# Altium footprint library Connectors_Old.PcbLib: 246 footprints (part 9 of 18)
Each footprint in its own frame and in the unit in brackets; x right, y up, seen from the top. Pads: shape width x height; smd on the part's side, far side on the other; paste and mask are expansions set on the pad; w line width, h text height; cw(c..) or ccw(c..) is an arc to the next point about the centre after c.
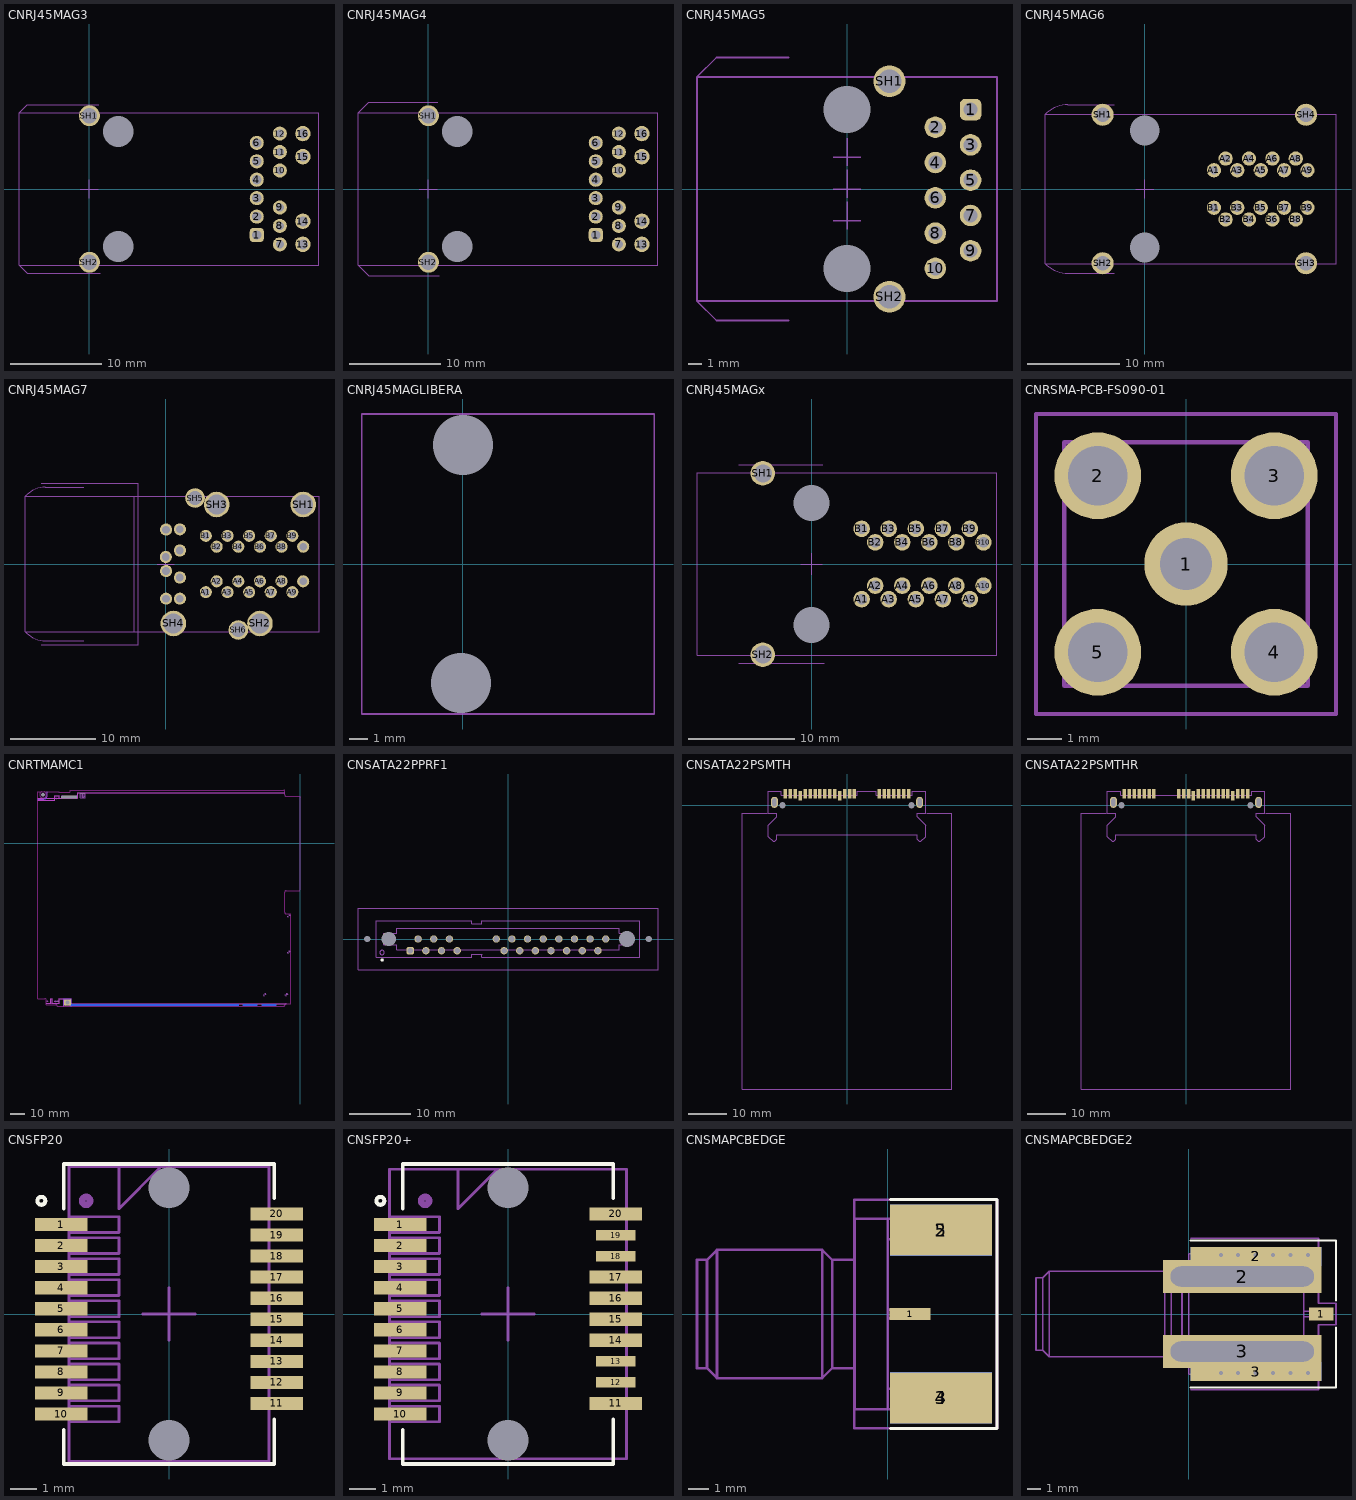
[diagram p8: the footprints below, top view; thin cyan lines are the x and y axes]

## CNRJ45MAG3 [mm] "Ethernet connector with magnetics and 3 LED"
height 15.01
pads (20):
  rrect50% 1.55x1.55 hole 1: 1(18.42,-5.07)
  round 1.55 hole 1: 2(18.42,-3.04) 3(18.42,-1.01) 4(18.42,1.02) 5(18.42,3.05) 6(18.42,5.08)
  round 1.55 hole 0.9: 7(20.96,-6.09) 8(20.96,-4.06) 9(20.96,-2.03) 10(20.96,2.04) 11(20.96,4.07) 12(20.96,6.1)
  round 1.7 hole 1.1: 13(23.5,-6.09) 14(23.5,-3.55) 15(23.5,3.56) 16(23.5,6.1)
  round 0 hole 3.4 unplated mask+1.8: MH1(3.18,-6.35) MH2(3.18,6.35)
  round 2.3 hole 1.7: SH1(0,8.065) SH2(0,-8.065)
Mechanical 13:
  lines w0.102: 1.05,9.3 -6.85,9.3 -7.75,8.4 ; 1.2,-9.3 -6.85,-9.3 -7.75,-8.4 ; -7.75,-8.4 -7.75,8.4 ; -7.75,-8.4 25.27,-8.4 25.27,8.4 -7.75,8.4
Mechanical 15:
  lines w0.102: -1,0 1,0 ; 0,-1 0,1
3D body: height 1.5, standoff 1, extent -7.239,1.605 10.7,2.205
3D body: height 1.5, standoff 1, extent -7.239,0.335 10.7,0.935
3D body: height 1.5, standoff 1, extent -7.239,2.875 10.7,3.475
3D body: height 1.5, standoff 1, extent -7.239,4.145 10.7,4.745
3D body: height 1.5, standoff 1, extent -7.239,-4.745 10.7,-4.145
3D body: height 1.5, standoff 1, extent -7.239,-3.475 10.7,-2.875
3D body: height 1.5, standoff 1, extent -7.239,-0.935 10.7,-0.335
3D body: height 13.9, standoff 13.4, extent -7.75,-8.4 25.3,8.4
3D body: height 1, standoff 0, extent -7.75,-8.4 25.3,8.4
3D body: height 1.5, standoff 1, extent -7.239,-2.205 10.7,-1.605
3D body: height 0, standoff -3.3, extent 1.516,-8.009 4.834,-4.691
3D body: height 0, standoff -3.3, extent 1.516,4.691 4.834,8.009
3D body: height 0, standoff -3.3, extent -0.794,-8.872 0.794,-7.258
3D body: height 0, standoff -3.3, extent -0.794,7.258 0.794,8.872
3D body: height 13, standoff 12, extent -7.9,-7 -7.75,-5
3D body: height 13, standoff 12, extent -7.9,5 -7.75,7
3D body: height 0, standoff -3.3, extent 17.907,-5.574 18.926,-4.554
3D body: height 0, standoff -3.3, extent 17.907,-3.544 18.926,-2.524
3D body: height 0, standoff -3.3, extent 17.907,-1.514 18.926,-0.494
3D body: height 0, standoff -3.3, extent 17.907,0.516 18.926,1.536
3D body: height 0, standoff -3.3, extent 17.907,2.546 18.926,3.566
3D body: height 0, standoff -3.3, extent 17.907,4.576 18.926,5.596
3D body: height 0, standoff -3.3, extent 20.447,5.596 21.466,6.616
3D body: height 0, standoff -3.3, extent 20.447,3.566 21.466,4.586
3D body: height 0, standoff -3.3, extent 20.447,1.536 21.466,2.556
3D body: height 0, standoff -3.3, extent 20.447,-2.534 21.466,-1.514
3D body: height 0, standoff -3.3, extent 20.447,-4.564 21.466,-3.544
3D body: height 0, standoff -3.3, extent 20.447,-6.594 21.466,-5.574
3D body: height 0, standoff -3.3, extent 22.951,-4.1 24.065,-2.986
3D body: height 0, standoff -3.3, extent 22.936,-6.647 24.05,-5.534
3D body: height 0, standoff -3.3, extent 22.951,3.01 24.065,4.124
3D body: height 0, standoff -3.3, extent 22.951,5.55 24.065,6.664
3D body: height 13.4, standoff 11, extent -7.75,-8.4 25.27,8.4
3D body: height 11, standoff 8.9, extent -7.75,-8.4 25.27,8.4
3D body: height 8.9, standoff 1, extent -7.75,-8.4 25.27,8.4
3D body: height 11.6, standoff 1, extent -7.361,-6.8 10.639,6.8
3D body: height 0, standoff -3.3, extent 23.18,-6.42 23.88,-5.72
3D body: height 0, standoff -3.3, extent 23.18,-3.88 23.88,-3.18
3D body: height 0, standoff -3.3, extent 23.18,3.23 23.88,3.93
3D body: height 0, standoff -3.3, extent 23.18,5.77 23.88,6.47

## CNRJ45MAG4 [mm] "Ethernet connector with magnetics and 3 LED"
height 15.01
pads (20):
  rrect50% 1.55x1.55 hole 1: 1(18.42,-5.07)
  round 1.55 hole 1: 2(18.42,-3.04) 3(18.42,-1.01) 4(18.42,1.02) 5(18.42,3.05) 6(18.42,5.08)
  round 1.55 hole 0.9: 7(20.96,-6.09) 8(20.96,-4.06) 9(20.96,-2.03) 10(20.96,2.04) 11(20.96,4.07) 12(20.96,6.1)
  round 1.7 hole 1.1: 13(23.5,-6.09) 14(23.5,-3.55) 15(23.5,3.56) 16(23.5,6.1)
  round 0 hole 3.4 unplated mask+1.8: MH1(3.18,-6.35) MH2(3.18,6.35)
  round 2.3 hole 1.7: SH1(0,8.065) SH2(0,-8.065)
Mechanical 13:
  lines w0.102: 1.05,9.575 -6.575,9.575 -7.75,8.4 ; 1.2,-9.575 -6.575,-9.575 -6.577,-9.573 -7.75,-8.4 ; -7.75,-8.4 -7.75,8.4 ; -7.75,-8.4 25.27,-8.4 25.27,8.4 -7.75,8.4
Mechanical 15:
  lines w0.102: -1,0 1,0 ; 0,-1 0,1
3D body: height 10, standoff 8, extent -7.7,-8.4 25.3,8.4
3D body: height 8, standoff 3, extent -7.7,-8.4 25.3,8.4
3D body: height 13.61, standoff 10, extent -7.7,-8.4 25.3,8.4
3D body: height 3, standoff 0, extent -7.7,-8.4 25.3,8.4
3D body: height 4, standoff 3, extent -7.75,-1.2 3,-0.2
3D body: height 0, standoff -3.3, extent 1.516,-8.009 4.834,-4.691
3D body: height 0, standoff -3.3, extent 1.516,4.691 4.834,8.009
3D body: height 0, standoff -3.3, extent -0.794,-8.872 0.794,-7.258
3D body: height 0, standoff -3.3, extent -0.794,7.258 0.794,8.872
3D body: height 15.01, standoff 13.61, extent -7.75,-6 3.1,-4.8
3D body: height 15.01, standoff 13.61, extent -7.75,4.8 3.1,6
3D body: height 4, standoff 3, extent -7.75,-5.7 3,-4.7
3D body: height 4, standoff 3, extent -7.75,-4.2 3,-3.2
3D body: height 4, standoff 3, extent -7.75,-2.7 3,-1.7
3D body: height 4, standoff 3, extent -7.75,0.3 3,1.3
3D body: height 4, standoff 3, extent -7.75,1.8 3,2.8
3D body: height 4, standoff 3, extent -7.75,3.3 3,4.3
3D body: height 4, standoff 3, extent -7.75,4.8 3,5.8
3D body: height 11, standoff 10, extent -8.1,-6.9 -7.75,-5.3
3D body: height 11, standoff 10, extent -8.1,5.3 -7.75,6.9
3D body: height 0, standoff -3.3, extent 17.907,-5.574 18.926,-4.554
3D body: height 0, standoff -3.3, extent 17.907,-3.544 18.926,-2.524
3D body: height 0, standoff -3.3, extent 17.907,-1.514 18.926,-0.494
3D body: height 0, standoff -3.3, extent 17.907,0.516 18.926,1.536
3D body: height 0, standoff -3.3, extent 17.907,2.546 18.926,3.566
3D body: height 0, standoff -3.3, extent 17.907,4.576 18.926,5.596
3D body: height 0, standoff -3.3, extent 20.447,5.596 21.466,6.616
3D body: height 0, standoff -3.3, extent 20.447,3.566 21.466,4.586
3D body: height 0, standoff -3.3, extent 20.447,1.536 21.466,2.556
3D body: height 0, standoff -3.3, extent 20.447,-2.534 21.466,-1.514
3D body: height 0, standoff -3.3, extent 20.447,-4.564 21.466,-3.544
3D body: height 0, standoff -3.3, extent 20.447,-6.594 21.466,-5.574
3D body: height 0, standoff -3.3, extent 22.951,-4.1 24.065,-2.986
3D body: height 0, standoff -3.3, extent 22.936,-6.647 24.05,-5.534
3D body: height 0, standoff -3.3, extent 22.951,3.01 24.065,4.124
3D body: height 0, standoff -3.3, extent 22.951,5.55 24.065,6.664
3D body: height 0, standoff -3.3, extent 23.18,-6.42 23.88,-5.72
3D body: height 0, standoff -3.3, extent 23.18,-3.88 23.88,-3.18
3D body: height 0, standoff -3.3, extent 23.18,3.23 23.88,3.93
3D body: height 0, standoff -3.3, extent 23.18,5.77 23.88,6.47

## CNRJ45MAG5 [mm] "Ethernet connector with magnetics"
height 15.01
pads (14):
  rrect50% 1.55x1.55 hole 1: 1(8.89,5.715)
  round 1.55 hole 1: 2(6.35,4.445) 3(8.89,3.175) 4(6.35,1.905) 5(8.89,0.635) 6(6.35,-0.635) 7(8.89,-1.905) 8(6.35,-3.175) 9(8.89,-4.445) 10(6.35,-5.715)
  round 0 hole 3.4 unplated mask+1.8: MH1(0,-5.715) MH2(0,5.715)
  round 2.3 hole 1.7: SH1(3.05,7.755) SH2(3.05,-7.755)
Mechanical 13:
  lines w0.127: -4.191,-9.465 -9.398,-9.465 -10.798,-8.065 -10.8,-8.065 ; -4.191,9.465 -9.398,9.465 -10.798,8.065 -10.8,8.065 ; -10.8,-8.065 10.79,-8.065 10.79,8.065 -10.8,8.065 ; -10.8,-8.065 -10.8,8.065
Mechanical 15:
  lines w0.102: -1,-2.286 1,-2.286 ; -1,0 1,0 ; -1,2.286 1,2.286 ; 0,-2.905 0,-0.905 ; 0,-0.619 0,1.381 ; 0,1.667 0,3.667
3D body: height 11, standoff 10, extent -10.8,-5.715 0,-4.953
3D body: height 11, standoff 10, extent -10.8,-4.191 0,-3.429
3D body: height 11, standoff 10, extent -10.8,-2.667 0,-1.905
3D body: height 11, standoff 10, extent -10.8,-1.143 0,-0.381
3D body: height 11, standoff 10, extent -10.8,0.381 0,1.143
3D body: height 11, standoff 10, extent -10.8,1.905 0,2.667
3D body: height 11, standoff 10, extent -10.8,3.429 0,4.191
3D body: height 11, standoff 10, extent -10.8,4.953 0,5.715
3D body: height 13.97, standoff 11, extent -10.8,-8.065 10.79,8.065
3D body: height 11, standoff 3, extent -10.8,-8.065 10.79,8.065
3D body: height 4, standoff 2, extent -10.8,-8.065 10.79,8.065
3D body: height 2, standoff 0, extent -10.798,-8.065 10.79,8.065
3D body: height 0, standoff -3.18, extent 8.372,5.197 9.408,6.233
3D body: height 0, standoff -3.18, extent 5.832,3.927 6.868,4.963
3D body: height 0, standoff -3.18, extent 8.372,2.657 9.408,3.693
3D body: height 0, standoff -3.18, extent 5.832,1.387 6.868,2.423
3D body: height 0, standoff -3.18, extent 8.372,0.117 9.408,1.153
3D body: height 0, standoff -3.18, extent 5.832,-1.153 6.868,-0.117
3D body: height 0, standoff -3.18, extent 8.372,-2.423 9.408,-1.387
3D body: height 0, standoff -3.18, extent 5.832,-3.693 6.868,-2.657
3D body: height 0, standoff -3.18, extent 8.372,-4.963 9.408,-3.927
3D body: height 0, standoff -3.18, extent 5.832,-6.233 6.868,-5.197
3D body: height 0, standoff -3.61, extent 2.203,6.902 3.893,8.618
3D body: height 0, standoff -3.61, extent 2.203,-8.608 3.893,-6.892
3D body: height 0, standoff -3.61, extent -1.71,4.005 1.71,7.425
3D body: height 0, standoff -3.61, extent -1.71,-7.425 1.71,-4.005

## CNRJ45MAG6 [mm] "Ethernet 2X1 connector with magnetics and 4 LED"
height 15.01
pads (24):
  round 1.55 hole 0.9: A1(7.518,2.032) A2(8.788,3.302) A3(10.058,2.032) A4(11.328,3.302) A5(12.598,2.032) A6(13.868,3.302) A7(15.138,2.032) A8(16.408,3.302) A9(17.678,2.032) B1(7.518,-2.032) B2(8.788,-3.302) B3(10.058,-2.032) B4(11.328,-3.302) B5(12.598,-2.032) B6(13.868,-3.302) B7(15.138,-2.032) B8(16.408,-3.302) B9(17.678,-2.032)
  round 0 hole 3.25 unplated mask+1.8: MH1(0,-6.35) MH2(0,6.35)
  round 2.4 hole 1.6: SH1(-4.572,8.064) SH2(-4.572,-8.064) SH3(17.526,-8.064) SH4(17.526,8.064)
Mechanical 13:
  lines w0.1: -10.795,-8.128 ccw(c-8.342,-5.675) -8.342,-9.144 -3.327,-9.144 ; -10.795,8.128 cw(c-8.342,5.675) -8.342,9.144 -3.327,9.144
  lines w0.102: -10.795,-8.128 20.777,-8.128 20.777,8.128 -10.795,8.128 -10.795,-8.128
Mechanical 15:
  lines w0.102: -1,0 1,0 ; 0,-1 0,1
3D body: height 0.64, standoff 0, extent -6.096,-8.128 20.777,8.128
3D body: height 0, standoff -3.3, extent 16.732,7.258 18.32,8.872
3D body: height 0, standoff -3.3, extent 16.732,-8.871 18.32,-7.257
3D body: height 0, standoff -3.3, extent 17.169,-2.542 18.188,-1.522
3D body: height 0, standoff -3.3, extent 15.899,-3.812 16.918,-2.792
3D body: height 0, standoff -3.3, extent 14.629,-2.542 15.648,-1.522
3D body: height 0, standoff -3.3, extent 13.359,-3.812 14.378,-2.792
3D body: height 0, standoff -3.3, extent 12.089,-2.542 13.108,-1.522
3D body: height 0, standoff -3.3, extent 10.819,-3.812 11.838,-2.792
3D body: height 0, standoff -3.3, extent 9.549,-2.542 10.568,-1.522
3D body: height 0, standoff -3.3, extent 8.279,-3.812 9.298,-2.792
3D body: height 0, standoff -3.3, extent 7.009,-2.542 8.028,-1.522
3D body: height 0, standoff -3.3, extent 17.169,1.522 18.188,2.542
3D body: height 0, standoff -3.3, extent 15.899,2.792 16.918,3.812
3D body: height 0, standoff -3.3, extent 14.629,1.522 15.648,2.542
3D body: height 0, standoff -3.3, extent 13.359,2.792 14.378,3.812
3D body: height 0, standoff -3.3, extent 12.089,1.522 13.108,2.542
3D body: height 0, standoff -3.3, extent 8.279,2.792 9.298,3.812
3D body: height 0, standoff -3.3, extent 10.819,2.792 11.838,3.812
3D body: height 0, standoff -3.3, extent 9.549,1.522 10.568,2.542
3D body: height 10.2, standoff 1.45, extent -10.5,-6.8 4.025,6.8
3D body: height 10.83, standoff 3.73, extent -10.75,-8.128 20.777,8.128
3D body: height 3.73, standoff 2.08, extent -10.75,-8.128 20.777,8.128
3D body: height 2.08, standoff 0.88, extent -10.75,-8.128 20.777,8.128
3D body: height 0, standoff -3.3, extent 7.009,1.522 8.028,2.542
3D body: height 0, standoff -3.3, extent -5.366,7.258 -3.778,8.872
3D body: height 0, standoff -3.3, extent -5.366,-8.871 -3.778,-7.257
3D body: height 0, standoff -3.3, extent -1.659,4.691 1.659,8.009
3D body: height 0, standoff -3.3, extent -1.659,-8.009 1.659,-4.691
3D body: height 10.2, standoff 9.7, extent -9.294,-2.205 8.645,-1.605
3D body: height 0.88, standoff 0.64, extent -10.75,-8.128 20.777,8.128
3D body: height 15.74, standoff 10.83, extent -10.75,-8.128 20.777,8.128
3D body: height 10.2, standoff 9.7, extent -9.294,-0.935 8.645,-0.335
3D body: height 10.2, standoff 9.7, extent -9.294,-3.475 8.645,-2.875
3D body: height 10.2, standoff 9.7, extent -9.294,-4.745 8.645,-4.145
3D body: height 10.2, standoff 9.7, extent -9.294,4.145 8.645,4.745
3D body: height 10.2, standoff 9.7, extent -9.294,2.875 8.645,3.475
3D body: height 10.2, standoff 9.7, extent -9.294,0.335 8.645,0.935
3D body: height 10.2, standoff 9.7, extent -9.294,1.605 8.645,2.205
3D body: height 22.83, standoff 15.74, extent -10.75,-8.128 20.777,8.128
3D body: height 24.49, standoff 22.83, extent -10.75,-8.128 20.777,8.128
3D body: height 25.59, standoff 24.49, extent -10.75,-8.128 20.777,8.128
3D body: height 25.84, standoff 25.59, extent -10.75,-8.128 20.777,8.128
3D body: height 23.85, standoff 15.1, extent -10.5,-6.8 4.025,6.8
3D body: height 15.6, standoff 15.1, extent -9.294,1.605 8.645,2.205
3D body: height 15.6, standoff 15.1, extent -9.294,0.335 8.645,0.935
3D body: height 15.6, standoff 15.1, extent -9.294,2.875 8.645,3.475
3D body: height 15.6, standoff 15.1, extent -9.294,4.145 8.645,4.745
3D body: height 15.6, standoff 15.1, extent -9.294,-4.745 8.645,-4.145
3D body: height 15.6, standoff 15.1, extent -9.294,-3.475 8.645,-2.875
3D body: height 15.6, standoff 15.1, extent -9.294,-0.935 8.645,-0.335
3D body: height 15.6, standoff 15.1, extent -9.294,-2.205 8.645,-1.605

## CNRJ45MAG7 [mil] "Ethernet 2X1 connector with magnetics and 4 LED"
height 590.94
pads (34):
  round 56 hole 35.43 mask+2: A1(185,-130) A2(235,-80) A3(285,-130) A4(335,-80) A5(385,-130) A6(435,-80) A7(485,-130) A8(535,-80) A9(585,-130) A10(635,-80) A11(0,32.5) A12(65,62.5) A13(1,-32.5) A14(65,-62.5) B1(185,130) B2(235,80) B3(285,130) B4(335,80) B5(385,130) B6(435,80) B7(485,130) B8(535,80) B9(585,130) B10(635,80) B11(1,159) B12(65,160) B13(1,-160) B14(65,-160)
  round 118.11 hole 90.55: SH1(635,275) SH2(435,-275) SH3(235,275) SH4(35,-275)
  round 90.55 hole 62.99: SH5(135,305)
  round 90.55 hole 66.93: SH6(335,-305)
Mechanical 13:
  lines w3.94: -650,-313 -643.36,-319.64 ccw(c-558,-234.29) -558,-355 -380,-355 ; -650,313 -643.36,319.64 cw(c-558,234.29) -558,355 -380,355
  lines w4: -650,-313 -650,313 ; 708,-313 708,313
  lines w4.02: -650,-313 708,-313 ; -650,313 708,313
Mechanical 14:
  lines w3.94: -650,-313 -145,-313 -145,313 -650,313 -650,-313
Mechanical 15:
  lines w3.94: -575,-373 -128,-373 -128,373 -575,373
  lines w4.02: -39.37,0 39.37,0 ; 0,-39.37 0,39.37
3D body: height 790.9, standoff -200.35, extent -662.08,-354.7 708,354.7

## CNRJ45MAGLIBERA [mil] "rj45 Ethernet Libera"
height 527.56
pads (2):
  round 1 hole 125.98: 0(0,250) 1(-3.94,-250)
Mechanical 13:
  lines w3.94: -212.6,-314.96 -212.6,314.96 401.57,314.96 401.57,-314.96 -212.6,-314.96
3D body: height 527.56, standoff 464.57, extent -212.6,-314.96 401.57,314.96
3D body: height 464.57, standoff 358.27, extent -212.6,-314.96 401.57,314.96
3D body: height 358.27, standoff 90.55, extent -212.6,-314.96 401.57,314.96
3D body: height 90.55, standoff 0, extent -212.6,-314.96 401.57,314.96

## CNRJ45MAGx [mm] "Ethernet 2X1 connector with magnetics and 4 LED"
height 15.01
pads (24):
  round 1.55 hole 1: A1(4.699,-3.302) A2(5.969,-2.032) A3(7.239,-3.302) A4(8.509,-2.032) A5(9.779,-3.302) A6(11.049,-2.032) A7(12.319,-3.302) A8(13.589,-2.032) A9(14.859,-3.302) A10(16.129,-2.032) B1(4.699,3.302) B2(5.969,2.032) B3(7.239,3.302) B4(8.509,2.032) B5(9.779,3.302) B6(11.049,2.032) B7(12.319,3.302) B8(13.589,2.032) B9(14.859,3.302) B10(16.129,2.032)
  round 0 hole 3.4 unplated mask+1.8: MH1(0,-5.715) MH2(0,5.715)
  round 2.3 hole 1.7: SH1(-4.572,8.509) SH2(-4.572,-8.509)
Mechanical 13:
  lines w0.102: -6.85,-9.3 1.2,-9.3 ; -6.85,9.3 1.05,9.3 ; -10.75,-8.575 -10.75,8.575 17.4,8.575 17.4,-8.575 -10.75,-8.575
Mechanical 15:
  lines w0.102: -1,0 1,0 ; 0,-1 0,1
3D body: height 24.7, standoff 22.75, extent -10.9,4.55 -10.75,6.95
3D body: height 24.7, standoff 22.75, extent -10.9,-6.95 -10.75,-4.55
3D body: height 15.6, standoff 15.1, extent -9.294,-2.205 8.645,-1.605
3D body: height 15.6, standoff 15.1, extent -9.294,-0.935 8.645,-0.335
3D body: height 15.6, standoff 15.1, extent -9.294,-3.475 8.645,-2.875
3D body: height 15.6, standoff 15.1, extent -9.294,-4.745 8.645,-4.145
3D body: height 15.6, standoff 15.1, extent -9.294,4.145 8.645,4.745
3D body: height 15.6, standoff 15.1, extent -9.294,2.875 8.645,3.475
3D body: height 15.6, standoff 15.1, extent -9.294,0.335 8.645,0.935
3D body: height 15.6, standoff 15.1, extent -9.294,1.605 8.645,2.205
3D body: height 23.85, standoff 15.1, extent -10.5,-6.8 4.025,6.8
3D body: height 25.2, standoff 24.95, extent -10.75,-8.575 17.4,8.575
3D body: height 24.95, standoff 23.85, extent -10.75,-8.575 17.4,8.575
3D body: height 23.85, standoff 22.2, extent -10.75,-8.575 17.4,8.575
3D body: height 22.2, standoff 15.1, extent -10.75,-8.575 17.4,8.575
3D body: height 10.2, standoff 9.7, extent -9.294,1.605 8.645,2.205
3D body: height 10.2, standoff 9.7, extent -9.294,0.335 8.645,0.935
3D body: height 10.2, standoff 9.7, extent -9.294,2.875 8.645,3.475
3D body: height 10.2, standoff 9.7, extent -9.294,4.145 8.645,4.745
3D body: height 10.2, standoff 9.7, extent -9.294,-4.745 8.645,-4.145
3D body: height 10.2, standoff 9.7, extent -9.294,-3.475 8.645,-2.875
3D body: height 10.2, standoff 9.7, extent -9.294,-0.935 8.645,-0.335
3D body: height 15.1, standoff 10.2, extent -10.75,-8.575 17.4,8.575
3D body: height 0.25, standoff 0, extent -10.75,-8.575 17.4,8.575
3D body: height 10.2, standoff 9.7, extent -9.294,-2.205 8.645,-1.605
3D body: height 0, standoff -3.3, extent -1.659,-7.374 1.659,-4.056
3D body: height 0, standoff -3.3, extent -1.659,4.056 1.659,7.374
3D body: height 0, standoff -3.3, extent -5.366,-9.316 -3.778,-7.702
3D body: height 0, standoff -3.3, extent -5.366,7.702 -3.778,9.316
3D body: height 2.6, standoff 0.65, extent -10.9,-6.95 -10.75,-4.55
3D body: height 2.6, standoff 0.65, extent -10.9,4.55 -10.75,6.95
3D body: height 0, standoff -3.3, extent 5.459,1.522 6.479,2.542
3D body: height 0, standoff -3.3, extent 4.189,2.792 5.209,3.812
3D body: height 1.45, standoff 0.25, extent -10.75,-8.575 17.4,8.575
3D body: height 3.1, standoff 1.45, extent -10.75,-8.575 17.4,8.575
3D body: height 10.2, standoff 3.1, extent -10.75,-8.575 17.4,8.575
3D body: height 10.2, standoff 1.45, extent -10.5,-6.8 4.025,6.8
3D body: height 0, standoff -3.3, extent 7.999,1.522 9.019,2.542
3D body: height 0, standoff -3.3, extent 9.269,2.792 10.289,3.812
3D body: height 0, standoff -3.3, extent 6.729,2.792 7.749,3.812
3D body: height 0, standoff -3.3, extent 10.539,1.522 11.559,2.542
3D body: height 0, standoff -3.3, extent 11.809,2.792 12.829,3.812
3D body: height 0, standoff -3.3, extent 13.079,1.522 14.099,2.542
3D body: height 0, standoff -3.3, extent 14.349,2.792 15.369,3.812
3D body: height 0, standoff -3.3, extent 15.619,1.522 16.639,2.542
3D body: height 0, standoff -3.3, extent 4.189,-3.812 5.209,-2.792
3D body: height 0, standoff -3.3, extent 5.459,-2.542 6.479,-1.522
3D body: height 0, standoff -3.3, extent 6.729,-3.812 7.749,-2.792
3D body: height 0, standoff -3.3, extent 7.999,-2.542 9.019,-1.522
3D body: height 0, standoff -3.3, extent 9.269,-3.812 10.289,-2.792
3D body: height 0, standoff -3.3, extent 10.539,-2.542 11.559,-1.522
3D body: height 0, standoff -3.3, extent 11.809,-3.812 12.829,-2.792
3D body: height 0, standoff -3.3, extent 13.079,-2.542 14.099,-1.522
3D body: height 0, standoff -3.3, extent 14.349,-3.812 15.369,-2.792
3D body: height 0, standoff -3.3, extent 15.619,-2.542 16.639,-1.522

## CNRSMA-PCB-FS090-01 [mm] "SMA vertical 7x7mm R5mm"
height 9.56
pads (5):
  round 2.4 hole 1.5: 1(0,0)
  round 2.5 hole 1.7: 2(-2.54,2.54) 3(2.54,2.54) 4(2.54,-2.54) 5(-2.54,-2.54)
Mechanical 13:
  lines w0.127: -3.5,-3.5 3.5,-3.5 3.5,3.5 -3.5,3.5 -3.5,-3.5
Mechanical 15:
  lines w0.127: -4.318,-4.318 4.318,-4.318 4.318,4.318 -4.318,4.318 -4.318,-4.318
3D body: height 0, standoff -3.94, extent 1.676,1.702 3.37,3.398
3D body: height 0, standoff -3.94, extent 1.702,-3.378 3.395,-1.682
3D body: height 0, standoff -3.94, extent -3.378,-3.404 -1.685,-1.707
3D body: height 0, standoff -3.94, extent -3.378,1.702 -1.685,3.398
3D body: height 0, standoff -3.94, extent -0.762,-0.762 0.732,0.735
3D body: height 9.57, standoff 9.56, extent -0.508,-0.508 0.488,0.49
3D body: height 9.56, standoff 3.7, extent -3.5,-3.493 3.472,3.493
3D body: height 9.57, standoff 9.56, extent -3.048,-2.94 2.928,3.048
3D body: height 3.7, standoff 0, extent -3.5,-3.5 3.5,3.5

## CNRTMAMC1 [mm] "AMC RTM pcb outline double width"
pads (11):
  oval 11x2 on Top Solder: 1(-159,31.95)
  oval 11x2 on Bottom Solder: 2(-159,31.95)
  rect 10x1 smd far side paste-3 mask-3: EP1(-21.5,-110.95) EP1(-21.5,-110.95) EP2(-34.5,-110.95) EP2(-34.5,-110.95)
  rect 4.7x4.4 / inner round 0 / far side rect 4.7x4.4 hole 2.7 copper offset 0,0.15 paste-2.54 mask+0.254: EP3(-160,-109.4)
  rect 115.5x1 smd far side paste-3 mask-3: EP3(-100.25,-110.95) EP3(-100.25,-110.95)
  round 0 hole 2.7 unplated paste-2.54 mask+1.8: MH2(-176.85,33.5)
  round 0 hole 1.6 slot 10.6 at 0 deg unplated: MH3(-159,31.95)
Top Layer keep-out:
  lines w0.1: -180.6,30.85 -175.665,30.85 ; -174.6,-109.9 -165.8,-109.9 -165.8,-106.8 -157.4,-106.8 -157.4,-111.75 ; -173.95,33.501 -173.95,35.65
  lines w0.102: -175.665,30.851 ccw(c-176.86,33.501) -173.953,33.494
Bottom Layer keep-out:
  lines w0.1: -162.625,-111.75 -162.625,-106.8 -157.4,-106.8 -157.4,-111.75
  lines w0.102: -180.6,30.5 -176.85,30.5 ccw(c-176.85,33.5) -173.85,33.493 -173.85,35.65
Top Solder:
  rectangle: -157.475,-111.9 -9.8,-110.1
  rectangle: -158,35.1 -10.6,36.9
Bottom Solder:
  rectangle: -158,35.1 -10.6,36.9
  rectangle: -157.475,-111.9 -9.8,-110.1
Keep-Out Layer:
  lines w0.1: -168,-110.75 -174.6,-110.75 -174.6,-107.55 ccw(c-175.6,-107.55) -175.6,-106.55 -180.6,-106.55 -180.6,35.65 -166.25,35.65 ccw(c-165.384,36.15) -165.384,35.15 -159,35.15 ccw(c-159,36.15) -158,36.15 -158,36.75 -11.3,36.75 cw(c-11.3,36.25) -10.8,36.25 -10.8,33.5 ccw(c-9.8,33.5) -9.8,32.5 -0.6,32.5 0,31.9 0,-31.9 -0.6,-32.5 -9.8,-32.5 ccw(c-9.8,-33.5) -10.8,-33.5 -10.8,-47.35 ccw(c-9.8,-47.35) -9.8,-48.35 -6.7,-48.35 -6.7,-110 -9.8,-110 ccw(c-9.8,-111) -10.8,-111 -10.8,-111.25 cw(c-11.3,-111.25) -11.3,-111.75 -167,-111.75
Keep-Out Layer:
  circle w0.1: c-160,-109.4 r2.3
  lines w0.1: -177.674,35.647 ccw(c-176.85,33.5) -176.026,35.647 ; -168,-110.75 cw(c-168,-111.75) -167,-111.75 ; -163.5,30.95 cw(c-163.5,31.95) -163.5,32.95 -154,32.95 cw(c-154,31.95) -154,30.95 -163.5,30.95
Mechanical 13 keep-out:
  lines w0.1: -180.6,30.95 -153.6,30.95 -153,31.55 -153,35 -10.8,35 ; -174.6,-109.9 -171.7,-109.9 -171.7,-106.8 -170.4,-106.8 -170.4,-109.9 -165.8,-109.9 -165.8,-106.8 -157.4,-106.8 -157.4,-110 -9.8,-110
Mechanical 14 keep-out:
  lines w0.1: -168.8,29.8 -168.8,32.975 -165.65,32.975 -165.65,30.95 -153.6,30.95 -153,31.55 -153,35 -10.8,35 ; -162.6,-111.75 -162.6,-106.8 -157.4,-106.8 -157.4,-110 -9.8,-110
  lines w0.102: -180.6,29.8 -168.8,29.8
Mechanical 15:
  lines w0.1: -174.25,-108.325 -173.45,-108.325 -173.85,-107.925 -173.85,-108.725 ; -168.6,-107.95 -168.6,-108.75 -169,-108.35 -166.5,-108.35 -166.9,-107.95 -166.9,-108.75 ; -168.167,31 -167.367,31 -167.767,30.6 -167.767,31.4 ; -167.75,-108.75 -167.75,-107.95 ; -151.35,32.7 -147.85,32.7 -149.6,31.3 -149.6,34.1 ; -25.7,-104 -24.7,-104 -24.7,-105 ; -10.7,-104 -9.7,-104 -9.7,-105 ; -9.2,-74.85 -8.2,-74.85 -8.2,-75.85 ; -9.2,-49.85 -8.2,-49.85 -8.2,-50.85 ; -23.7,-103.6 -24.3,-103 -24.3,-103.6 -23.7,-103.6 ; -23.7,-103.6 -23.7,-103.6 ; -8.7,-103.6 -9.3,-103 -9.3,-103.6 -8.7,-103.6 ; -8.7,-103.6 -8.7,-103.6 ; -7.2,-74.45 -7.8,-74.45 -7.8,-73.85 -7.2,-74.45 ; -7.2,-74.45 -7.2,-74.45 ; -7.2,-49.45 -7.8,-48.85 -7.8,-49.45 -7.2,-49.45 ; -7.2,-49.45 -7.2,-49.45 ; -151.35,31.3 -151.35,34.1 -147.85,34.1 -147.85,31.3 -151.35,31.3

## CNSATA22PPRF1 [mm] "Connector SATA Vertical, PRSF; 22 pin; R1.27 mm; Body 42.37 x 6 x 9.85 mm (LxWxH)"
height 9.85
pads (26):
  round 0 hole 1 unplated mask+1: MH1(-22.865,0) MH4(22.865,0)
  round 1.1 hole 2.3 unplated mask+1.1: MH2(-19.365,0)
  round 1.2 hole 2.6 unplated mask+1.1: MH3(19.365,0)
  round 1.2 hole 0.9: P1(-1.905,0) P2(-0.635,-1.905) P3(0.635,0) P4(1.905,-1.905) P5(3.175,0) P6(4.445,-1.905) P7(5.715,0) P8(6.985,-1.905) P9(8.255,0) P10(9.525,-1.905) P11(10.795,0) P12(12.065,-1.905) P13(13.335,0) P14(14.605,-1.905) P15(15.875,0) S2(-14.605,0) S3(-13.335,-1.905) S4(-12.065,0) S5(-10.795,-1.905) S6(-9.525,0) S7(-8.255,-1.905)
  rrect50% 1.2x1.2 hole 0.9: S1(-15.875,-1.905)
Top Overlay:
  circle w0.25: c-20.441,-3.4 r0.141
Mechanical 13:
  circle w0.127: c-20.461,-2.2 r0.361
  lines w0.102: -5.9,-2.5 -5.9,-3 -21.365,-3 -21.365,3 -5.9,3 -5.9,2.5 ; -5.9,-2.5 -5.9,-2.5 ; -5.9,-2.5 -4.3,-2.5 -4.28,-2.52 -4.28,-3 21.365,-3 21.365,3 -4.28,3 -4.28,2.52 -4.3,2.5 -5.9,2.5 ; -5.9,2.5 -5.9,2.5 ; -20.215,-0.95 -20.215,0.95 -18.095,0.95 -18.095,1.75 -5.9,1.75 -5.6,1.75 18.095,1.75 18.095,0.95 20.215,0.95 20.215,-0.95 18.095,-0.95 18.095,-1.75 -18.095,-1.75 -18.095,-0.95 -20.215,-0.95
Mechanical 15:
  lines w0.102: -24.365,-5 -24.365,5 24.365,5 24.365,-5 -24.365,-5
  text "Press-Fit KEEP-OUT Zone" at -17.78,3.81 h1.5
3D body: height 2.95, standoff 0, extent -21.365,-3 21.365,3
3D body: height 0, standoff -3.7, extent -20.51,-1.16 -18.215,1.16
3D body: height 0, standoff -3.7, extent 18.064,-1.311 20.661,1.311
3D body: height 0, standoff -3.6, extent 15.48,-0.225 16.255,0.225
3D body: height 0, standoff -3.6, extent 14.21,-2.13 14.985,-1.68
3D body: height 0, standoff -3.6, extent 12.94,-0.225 13.715,0.225
3D body: height 0, standoff -3.6, extent 11.67,-2.13 12.445,-1.68
3D body: height 0, standoff -3.6, extent 10.4,-0.225 11.175,0.225
3D body: height 0, standoff -3.6, extent 9.13,-2.13 9.905,-1.68
3D body: height 0, standoff -3.6, extent 7.86,-0.225 8.635,0.225
3D body: height 0, standoff -3.6, extent 6.59,-2.13 7.365,-1.68
3D body: height 0, standoff -3.6, extent 5.32,-0.225 6.095,0.225
3D body: height 0, standoff -3.6, extent 4.05,-2.13 4.825,-1.68
3D body: height 0, standoff -3.6, extent 2.78,-0.225 3.555,0.225
3D body: height 0, standoff -3.6, extent 1.51,-2.13 2.285,-1.68
3D body: height 0, standoff -3.6, extent 0.24,-0.225 1.015,0.225
3D body: height 0, standoff -3.6, extent -1.03,-2.13 -0.255,-1.68
3D body: height 0, standoff -3.6, extent -2.3,-0.225 -1.525,0.225
3D body: height 0, standoff -3.6, extent -8.65,-2.13 -7.875,-1.68
3D body: height 0, standoff -3.6, extent -9.92,-0.225 -9.145,0.225
3D body: height 0, standoff -3.6, extent -11.19,-2.13 -10.415,-1.68
3D body: height 0, standoff -3.6, extent -12.46,-0.225 -11.685,0.225
3D body: height 0, standoff -3.6, extent -13.73,-2.13 -12.955,-1.68
3D body: height 0, standoff -3.6, extent -16.27,-2.13 -15.495,-1.68
3D body: height 0, standoff -3.6, extent -15,-0.225 -14.225,0.225
3D body: height 8, standoff 2.95, extent 15.455,-0.7 16.33,-0.3
3D body: height 8, standoff 2.95, extent 12.915,-0.7 13.79,-0.3
3D body: height 8, standoff 2.95, extent 10.375,-0.7 11.25,-0.3
3D body: height 8, standoff 2.95, extent 7.835,-0.7 8.71,-0.3
3D body: height 8, standoff 2.95, extent -2.325,-0.7 -1.45,-0.3
3D body: height 8, standoff 2.95, extent 14.18,-0.7 15.055,-0.3
3D body: height 8, standoff 2.95, extent 11.64,-0.7 12.515,-0.3
3D body: height 8, standoff 2.95, extent 9.1,-0.7 9.975,-0.3
3D body: height 8, standoff 2.95, extent -1.06,-0.7 -0.185,-0.3
3D body: height 8, standoff 2.95, extent 1.48,-0.7 2.355,-0.3
3D body: height 8, standoff 2.95, extent 4.02,-0.7 4.895,-0.3
3D body: height 8, standoff 2.95, extent 6.56,-0.7 7.435,-0.3
3D body: height 8, standoff 2.95, extent 0.215,-0.7 1.09,-0.3
3D body: height 8, standoff 2.95, extent 2.765,-0.7 3.64,-0.3
3D body: height 8, standoff 2.95, extent 5.303,-0.7 6.178,-0.3
3D body: height 8, standoff 2.95, extent -9.937,-0.7 -9.062,-0.3
3D body: height 8, standoff 2.95, extent -12.475,-0.7 -11.6,-0.3
3D body: height 8, standoff 2.95, extent -15.025,-0.7 -14.15,-0.3
3D body: height 8, standoff 2.95, extent -8.68,-0.7 -7.805,-0.3
3D body: height 8, standoff 2.95, extent -11.22,-0.7 -10.345,-0.3
3D body: height 8, standoff 2.95, extent -13.76,-0.7 -12.885,-0.3
3D body: height 8, standoff 2.95, extent -16.3,-0.7 -15.425,-0.3
3D body: height 9.85, standoff 2.95, extent -20.215,-0.95 -18.095,0.95
3D body: height 8.15, standoff 2.95, extent -18.095,-0.005 18.1,1.75
3D body: height 8.15, standoff 2.95, extent -18.1,-1.75 18.1,0
3D body: height 9.85, standoff 2.95, extent 18.095,-0.95 20.215,0.95

## CNSATA22PSMTH [mm] "Connector SATA Horizontal, SMTP; 22 pin; R1.27 mm; Body 40.43 x 12.87 x 6.74 mm (LxWxH)"
height 6.74
pads (26):
  round 0.7 hole 1.6 unplated: MH1(16.6,0) MH2(-16.6,0)
  oval 1.8x2.88 hole 1 slot 2.08 at 90 deg unplated: MH3(18.71,0.76) MH4(-18.71,0.76)
  rect 0.9x2.4 smd: P1(1.905,3) P2(0.635,3) P3(-0.635,3) P4(-1.905,2.5) P5(-3.175,3) P6(-4.445,3) P7(-5.715,3) P8(-6.985,3) P9(-8.255,3) P10(-9.525,3) P11(-10.795,3) P12(-12.065,2.5) P13(-13.335,3) P14(-14.605,3) P15(-15.875,3) S1(15.88,3) S2(14.61,3) S3(13.34,3) S4(12.07,3) S5(10.8,3) S6(9.53,3) S7(8.26,3)
Mechanical 13:
  lines w0.102: 16.815,2.616 7.544,2.616 7.544,3.607 2.591,3.607 2.591,2.591 -16.891,2.591 -16.891,3.607 -20.244,3.607 -20.244,-2.083 ; 16.84,2.616 16.84,3.607 20.218,3.607 20.218,-2.083 18.085,-2.083 18.085,-2.946 20.218,-5.08 20.218,-8.103 19.025,-9.296 18.593,-9.296 18.085,-8.788 18.085,-7.569 -18.11,-7.569 -18.11,-8.788 -18.618,-9.296 -19.05,-9.296 -20.244,-8.103 -20.244,-5.08 -18.11,-2.946 -18.11,-2.083 ; -20.244,-2.083 -18.11,-2.083 ; -20.244,-2.083 -18.11,-2.083
Mechanical 15:
  lines w0.102: -20.525,-2.083 -27.025,-2.083 -27.025,-73.1 27,-73.1 27,-2.083 20.5,-2.083
3D body: height 5.74, standoff 5.24, extent 15.55,-7.569 16.45,-3.2
3D body: height 5.74, standoff 5.24, extent 14.2,-7.569 15.1,-3.2
3D body: height 5.74, standoff 5.24, extent 12.95,-7.569 13.85,-3.2
3D body: height 5.74, standoff 5.24, extent 11.7,-7.569 12.6,-3.2
3D body: height 5.74, standoff 5.24, extent 10.45,-7.569 11.35,-3.2
3D body: height 5.74, standoff 5.24, extent 9.2,-7.569 10.1,-3.2
3D body: height 5.74, standoff 5.24, extent 7.95,-7.569 8.85,-3.2
3D body: height 5.74, standoff 5.24, extent 1.2,-7.569 2.1,-3.2
3D body: height 5.74, standoff 5.24, extent -0.05,-7.569 0.85,-3.2
3D body: height 5.74, standoff 5.24, extent -1.3,-7.569 -0.4,-3.2
3D body: height 5.74, standoff 5.24, extent -2.55,-7.569 -1.65,-3.2
3D body: height 5.74, standoff 5.24, extent -3.8,-7.569 -2.9,-3.2
3D body: height 5.74, standoff 5.24, extent -5.05,-7.569 -4.15,-3.2
3D body: height 5.74, standoff 5.24, extent -6.3,-7.569 -5.4,-3.2
3D body: height 5.74, standoff 5.24, extent -7.55,-7.569 -6.65,-3.2
3D body: height 5.74, standoff 5.24, extent -8.8,-7.569 -7.9,-3.2
3D body: height 5.74, standoff 5.24, extent -10.05,-7.569 -9.15,-3.2
3D body: height 5.74, standoff 5.24, extent -11.3,-7.569 -10.4,-3.2
3D body: height 5.74, standoff 5.24, extent -12.55,-7.569 -11.65,-3.2
3D body: height 5.74, standoff 5.24, extent -13.8,-7.569 -12.9,-3.2
3D body: height 5.74, standoff 5.24, extent -15.05,-7.569 -14.15,-3.2
3D body: height 5.74, standoff 5.24, extent -16.3,-7.569 -15.4,-3.2
3D body: height 6.74, standoff 5.74, extent -18.11,-7.569 18.085,-2.083
3D body: height 5.74, standoff 4.24, extent -18.11,-7.569 18.085,-2.083
3D body: height 4.24, standoff 3.24, extent -18.11,-7.569 18.085,-2.083
3D body: height 3.24, standoff 0, extent -20.244,-2.083 20.218,3.607
3D body: height 0, standoff -2, extent -17.406,-0.794 -15.792,0.794
3D body: height 0, standoff -2, extent 15.794,-0.794 17.408,0.794
3D body: height 0, standoff -2, extent -19.211,-0.289 -18.202,1.813
3D body: height 0, standoff -2, extent 18.209,-0.289 19.218,1.813
3D body: height 6.74, standoff 3.24, extent -18.11,-2.083 18.085,3.607
3D body: height 6, standoff 4.24, extent -20.244,-9.296 -18.11,-2.946
3D body: height 6, standoff 4.24, extent 18.085,-9.296 20.218,-2.946

## CNSATA22PSMTHR [mm] "Connector SATA Horizontal, SMTP; 22 pin; R1.27 mm; Body 40.43 x 12.87 x 4.30 mm (LxWxH)"
height 4.3
pads (26):
  round 0.7 hole 1.6 unplated: MH1(16.6,0) MH2(-16.6,0)
  oval 1.8x2.88 hole 1 slot 2.08 at 90 deg: MH3(18.71,0.76) MH4(-18.71,0.76)
  rect 0.9x2.4 smd: P1(-1.905,3) P2(-0.635,3) P3(0.635,3) P4(1.905,2.5) P5(3.175,3) P6(4.445,3) P7(5.715,3) P8(6.985,3) P9(8.255,3) P10(9.525,3) P11(10.795,3) P12(12.065,2.5) P13(13.335,3) P14(14.605,3) P15(15.875,3) S1(-15.88,3) S2(-14.61,3) S3(-13.34,3) S4(-12.07,3) S5(-10.8,3) S6(-9.53,3) S7(-8.26,3)
Mechanical 13:
  lines w0.102: -16.891,3.607 -20.244,3.607 -20.244,-2.083 ; -16.84,2.591 16.891,2.591 16.891,3.607 ; -16.84,2.616 -16.84,3.607 ; 16.84,3.607 20.218,3.607 20.218,-2.083 18.085,-2.083 18.085,-2.946 20.218,-5.08 20.218,-8.103 19.025,-9.296 18.593,-9.296 18.085,-8.788 18.085,-7.569 -18.11,-7.569 -18.11,-8.788 -18.618,-9.296 -19.05,-9.296 -20.244,-8.103 -20.244,-5.08 -18.11,-2.946 -18.11,-2.083 ; -20.244,-2.083 -18.11,-2.083 ; -20.244,-2.083 -18.11,-2.083
Mechanical 15:
  lines w0.102: -20.525,-2.083 -27.025,-2.083 -27.025,-73.1 27,-73.1 27,-2.083 20.5,-2.083
3D body: height 3.55, standoff 1.55, extent 18.085,-9.296 20.218,-2.946
3D body: height 3.55, standoff 1.55, extent -20.244,-9.296 -18.11,-2.946
3D body: height 0, standoff -2, extent 18.209,-0.289 19.218,1.813
3D body: height 0, standoff -2, extent -19.211,-0.289 -18.202,1.813
3D body: height 0, standoff -2, extent 15.794,-0.794 17.408,0.794
3D body: height 0, standoff -2, extent -17.406,-0.794 -15.792,0.794
3D body: height 4.3, standoff 0, extent -20.244,-2.083 20.218,3.607
3D body: height 2.25, standoff 0.8, extent -18.11,-7.569 18.085,-2.083
3D body: height 4.1, standoff 2.25, extent -18.085,-7.569 18.11,-2.083
3D body: height 4.3, standoff 4.1, extent -18.11,-7.569 18.085,-2.083
3D body: height 2.35, standoff 2.25, extent 15.4,-7.569 16.3,-3.2
3D body: height 2.35, standoff 2.25, extent 14.15,-7.569 15.05,-3.2
3D body: height 2.35, standoff 2.25, extent 12.9,-7.569 13.8,-3.2
3D body: height 2.35, standoff 2.25, extent 11.65,-7.569 12.55,-3.2
3D body: height 2.35, standoff 2.25, extent 10.4,-7.569 11.3,-3.2
3D body: height 2.35, standoff 2.25, extent 9.15,-7.569 10.05,-3.2
3D body: height 2.35, standoff 2.25, extent 7.9,-7.569 8.8,-3.2
3D body: height 2.35, standoff 2.25, extent 6.65,-7.569 7.55,-3.2
3D body: height 2.35, standoff 2.25, extent 5.4,-7.569 6.3,-3.2
3D body: height 2.35, standoff 2.25, extent 4.15,-7.569 5.05,-3.2
3D body: height 2.35, standoff 2.25, extent 2.9,-7.569 3.8,-3.2
3D body: height 2.35, standoff 2.25, extent 1.65,-7.569 2.55,-3.2
3D body: height 2.35, standoff 2.25, extent 0.4,-7.569 1.3,-3.2
3D body: height 2.35, standoff 2.25, extent -0.85,-7.569 0.05,-3.2
3D body: height 2.35, standoff 2.25, extent -2.1,-7.569 -1.2,-3.2
3D body: height 2.35, standoff 2.25, extent -8.85,-7.569 -7.95,-3.2
3D body: height 2.35, standoff 2.25, extent -10.1,-7.569 -9.2,-3.2
3D body: height 2.35, standoff 2.25, extent -11.35,-7.569 -10.45,-3.2
3D body: height 2.35, standoff 2.25, extent -12.6,-7.569 -11.7,-3.2
3D body: height 2.35, standoff 2.25, extent -13.85,-7.569 -12.95,-3.2
3D body: height 2.35, standoff 2.25, extent -15.1,-7.569 -14.2,-3.2
3D body: height 2.35, standoff 2.25, extent -16.45,-7.569 -15.55,-3.2

## CNSFP20 [mm] "SFP Transciever 20 pin Tyco 1367073-1"
height 5.4
pads (22):
  rect 2x0.5 smd: 1(-4.1,3.4) 2(-4.1,2.6) 3(-4.1,1.8) 4(-4.1,1) 5(-4.1,0.2) 6(-4.1,-0.6) 7(-4.1,-1.4) 8(-4.1,-2.2) 9(-4.1,-3) 10(-4.1,-3.8) 11(4.1,-3.4) 12(4.1,-2.6) 13(4.1,-1.8) 14(4.1,-1) 15(4.1,-0.2) 16(4.1,0.6) 17(4.1,1.4) 18(4.1,2.2) 19(4.1,3) 20(4.1,3.8)
  round 0 hole 1.55 unplated: 21(0,4.8) 22(0,-4.8)
Top Overlay:
  circle w0.15: c-4.85,4.3 r0.15
  lines w0.15: -4,-4.4 -4,-5.7 4,-5.7 4,-4 ; -4,4 -4,5.7 4,5.7 4,4.4
Mechanical 13:
  circle w0.25: c-3.15,4.3 r0.15
  lines w0.102: -3.8,-4.1 -1.9,-4.1 -1.9,-3.5 -3.8,-3.5 ; -3.8,-3.3 -1.9,-3.3 -1.9,-2.7 -3.8,-2.7 ; -3.8,-2.5 -1.9,-2.5 -1.9,-1.9 -3.8,-1.9 ; -3.8,-1.7 -1.9,-1.7 -1.9,-1.1 -3.8,-1.1 ; -3.8,-0.9 -1.9,-0.9 -1.9,-0.3 -3.8,-0.3 ; -3.8,-0.1 -1.9,-0.1 -1.9,0.5 -3.8,0.5 ; -3.8,0.7 -1.9,0.7 -1.9,1.3 -3.8,1.3 ; -3.8,1.5 -1.9,1.5 -1.9,2.1 -3.8,2.1 ; -3.8,2.3 -1.9,2.3 -1.9,2.9 -3.8,2.9 ; -3.8,3.1 -1.9,3.1 -1.9,3.7 -3.8,3.7 ; -1.9,5.6 -1.9,4 -0.3,5.6 ; -3.8,-5.6 -3.8,5.6 3.8,5.6 3.8,-5.6 -3.8,-5.6
Mechanical 15:
  lines w0.102: -1,0 1,0 ; 0,-1 0,1
3D body: height 5.23, standoff -0.79, extent -4.5,-5.5 4.5,5.5

## CNSFP20+ [mm] "SFP Transciever 20 pin Tyco 18888247-1"
height 5.4
pads (22):
  rect 2x0.5 smd: 1(-4.1,3.4) 2(-4.1,2.6) 3(-4.1,1.8) 4(-4.1,1) 5(-4.1,0.2) 6(-4.1,-0.6) 7(-4.1,-1.4) 8(-4.1,-2.2) 9(-4.1,-3) 10(-4.1,-3.8) 11(4.1,-3.4) 14(4.1,-1) 15(4.1,-0.2) 16(4.1,0.6) 17(4.1,1.4) 20(4.1,3.8)
  rect 1.5x0.4 smd: 12(4.1,-2.6) 13(4.1,-1.8) 18(4.1,2.2) 19(4.1,3)
  round 0 hole 1.55 unplated: 21(0,4.8) 22(0,-4.8)
Top Overlay:
  circle w0.15: c-4.85,4.3 r0.15
  lines w0.15: -4,-4.4 -4,-5.7 4,-5.7 4,-4 ; -4,4 -4,5.7 4,5.7 4,4.4
Mechanical 13:
  circle w0.25: c-3.15,4.3 r0.15
  lines w0.102: -4.5,-4.1 -2.6,-4.1 -2.6,-3.5 -4.5,-3.5 ; -4.5,-3.3 -2.6,-3.3 -2.6,-2.7 -4.5,-2.7 ; -4.5,-2.5 -2.6,-2.5 -2.6,-1.9 -4.5,-1.9 ; -4.5,-1.7 -2.6,-1.7 -2.6,-1.1 -4.5,-1.1 ; -4.5,-0.9 -2.6,-0.9 -2.6,-0.3 -4.5,-0.3 ; -4.5,-0.1 -2.6,-0.1 -2.6,0.5 -4.5,0.5 ; -4.5,0.7 -2.6,0.7 -2.6,1.3 -4.5,1.3 ; -4.5,1.5 -2.6,1.5 -2.6,2.1 -4.5,2.1 ; -4.5,2.3 -2.6,2.3 -2.6,2.9 -4.5,2.9 ; -4.5,3.1 -2.6,3.1 -2.6,3.7 -4.5,3.7 ; -1.9,5.5 -1.9,4 -0.4,5.5 ; -4.5,-5.5 -4.5,5.5 4.5,5.5 4.5,-5.5 -4.5,-5.5
Mechanical 15:
  lines w0.102: -1,0 1,0 ; 0,-1 0,1
3D body: height 5.24, standoff -0.78, extent -4.5,-5.5 4.5,5.5

## CNSMAPCBEDGE [mil] "SMA PCB edge female"
height 312
pads (5):
  rect 80x24 smd: 1(44,0)
  rect 200x100 smd: 2(105,165) 3(105,-165)
  rect 200x100 smd far side: 4(105,-165) 5(105,165)
Top Overlay:
  lines w5.91: 5.14,-225 215,-225 215,225 5.14,225
Mechanical 13:
  lines w5: -64.96,-106.3 -109.03,-106.3 ; -64.96,106.3 -109.03,106.3 ; 0,-147 187.01,-147 187.01,-187 0,-187 ; 0,-8 73,-8 73,8 0,8 ; 0,147 187.01,147 187.01,187 0,187 ; -355.31,-106.3 -355.31,106.3 ; -355.31,-106.3 -335.63,-125.98 ; -355.31,-106.3 -375,-106.3 -375,106.3 -355.31,106.3 ; -355.31,106.3 -335.63,125.98 ; -335.63,-125.98 -335.63,-122.05 -335.63,125.98 ; -335.63,-125.98 -296.26,-125.98 ; -335.63,-125.98 -128.72,-125.98 ; -335.63,125.98 -128.72,125.98 ; -296.26,-125.98 -296.26,-125.98 ; -128.72,-125.98 -128.72,125.98 ; -128.72,-125.98 -109.03,-106.3 ; -128.72,125.98 -128.72,125.98 ; -128.72,125.98 -109.03,106.3 ; -109.03,-106.3 -109.03,106.3 ; -109.03,-106.3 -109.03,-106.3 ; 0,-187 -64.96,-187 -64.96,187 0,187 ; 0,-187 0,-137.8 0,137.8 0,187
Mechanical 15:
  lines w5: -65.72,-225 -65.72,225 215,225 215,-225 -65.72,-225
3D body: height 172.05, standoff -140.16, extent -375.19,-187.8 187.01,187.79

## CNSMAPCBEDGE2 [mm] "SMA PCB edge female 2"
height 6
pads (7):
  rect 1.8x1 smd paste-5: 1(9.9,0)
  rect 11.8x2.5 hole 1.5 slot 10.7 at 0 deg mask+0.254: 2(4,2.8) 3(4,-2.8)
  rect 9.75x1.4 smd paste-10: 2(5.025,4.3) 3(5.025,-4.3)
  rect 9.75x1.4 smd far side paste-10: 2(5.025,4.3) 3(5.025,-4.3)
via 5,-4.4 diameter 0.65 hole 0.3
via 3.7,-4.4 diameter 0.65 hole 0.3
via 2.4,-4.4 diameter 0.65 hole 0.3
via 6.3,-4.4 diameter 0.65 hole 0.3
via 7.6,-4.4 diameter 0.65 hole 0.3
via 8.9,-4.4 diameter 0.65 hole 0.3
via 8.9,4.4 diameter 0.65 hole 0.3
via 7.6,4.4 diameter 0.65 hole 0.3
via 6.3,4.4 diameter 0.65 hole 0.3
via 2.4,4.4 diameter 0.65 hole 0.3
via 3.7,4.4 diameter 0.65 hole 0.3
via 5,4.4 diameter 0.65 hole 0.3
Top Overlay:
  lines w0.15: 0.131,-5.5 11,-5.5 11,-1 ; 0.131,5.5 11,5.5 11,1
Top Solder:
  rectangle: 0,1.5 8.6,5
  rectangle: 0,-5 8.6,-1.5
  region: 8.6,-1.993 8.809,-2.021 9.003,-2.101 9.171,-2.229 9.299,-2.397 9.379,-2.591 9.407,-2.8 9.4,-2.8 9.407,-2.8 9.379,-3.009 9.299,-3.203 9.171,-3.371 9.003,-3.499 8.809,-3.579 8.6,-3.607 8.6,-3.6
  region: 8.6,1.993 8.809,2.021 9.003,2.101 9.171,2.229 9.299,2.397 9.379,2.591 9.407,2.8 9.4,2.8 9.407,2.8 9.379,3.009 9.299,3.203 9.171,3.371 9.003,3.499 8.809,3.579 8.6,3.607 8.6,3.6
Bottom Solder:
  rectangle: 0,1.5 8.6,4.3
  rectangle: 0,-4.3 8.6,-1.5
  region: 8.6,-1.997 8.809,-2.024 9.003,-2.105 9.171,-2.233 9.299,-2.4 9.379,-2.595 9.407,-2.803 9.4,-2.803 9.407,-2.803 9.379,-3.012 9.299,-3.207 9.171,-3.374 9.003,-3.502 8.809,-3.583 8.6,-3.61 8.6,-3.603
  region: 8.6,1.997 8.809,2.024 9.003,2.105 9.171,2.233 9.299,2.4 9.379,2.595 9.407,2.803 9.4,2.803 9.407,2.803 9.379,3.012 9.299,3.207 9.171,3.374 9.003,3.502 8.809,3.583 8.6,3.61 8.6,3.603
Mechanical 13:
  lines w0.127: -1.8,-3.2 -10.4,-3.2 ; -1.8,3.2 -10.4,3.2 ; -1.3,-2.7 -0.5,-2.7 ; -1.3,2.7 -0.5,2.7 ; 0,-3.2 -0.5,-3.2 -0.5,3.2 0,3.2 ; 8.6,-0.203 10.6,-0.203 10.6,0.203 8.6,0.203 ; -10.9,-2.7 -11.4,-2.7 -11.4,2.7 -10.9,2.7 ; -10.9,-2.7 -10.4,-3.2 ; -10.9,-2.7 -10.9,2.7 ; -10.9,2.7 -10.4,3.2 ; -10.4,-3.2 -9.4,-3.2 ; -10.4,-3.2 -10.4,-3.1 -10.4,3.2 ; -9.4,-3.2 -9.4,-3.2 ; -1.794,3.2 -1.294,2.7 -1.294,-2.7 ; -1.794,3.2 -1.794,-3.2 -1.294,-2.7 ; -1.794,3.2 -1.794,3.2 ; -1.294,-2.7 -1.294,-2.7 ; 0,-3.5 0,-4.5 8.6,-4.5 8.6,-3.5 ; 0,-3.5 8.6,-3.5 ; 0,-3.5 0,3.5 ; 0,3.5 0,4.5 8.6,4.5 8.6,3.5 ; 0,3.5 8.6,3.5 ; 8.6,-3.5 8.6,3.5
Mechanical 15:
  lines w0.127: 0,-4.5 0,-2.8 8.6,-2.8 8.6,2.8 0,2.8 0,4.5 ; 0.15,-5.65 9.7,-5.65 9.7,-0.8 11,-0.8 11,0.8 9.7,0.8 9.7,5.65 0.15,5.65
  text "PCB MILLING LINE" at -4,1.7 h0.8
3D body: height 4.1, standoff -2.9, extent -11.4,-4.472 10.6,4.472